# Altium footprint library QFP_QFN_DFN.PcbLib: 36 footprints (part 3 of 3)
Each footprint in its own frame and in the unit in brackets; x right, y up, seen from the top. Pads: shape width x height; smd on the part's side, far side on the other; paste and mask are expansions set on the pad; w line width, h text height; cw(c..) or ccw(c..) is an arc to the next point about the centre after c.
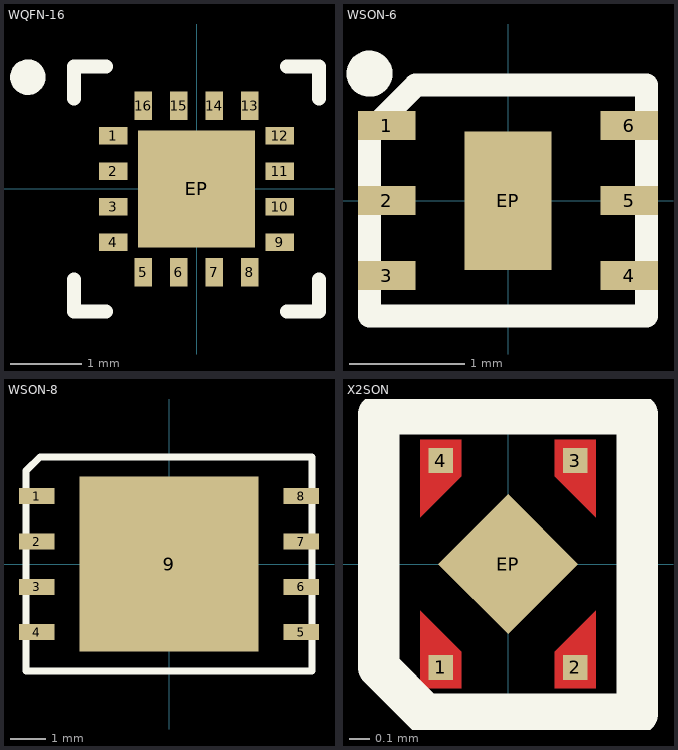
[diagram p2: the footprints below, top view; thin cyan lines are the x and y axes]

## WQFN-16 [mm]
height 0.8
pads (17):
  rect 0.4x0.25 smd: 1(-1.175,0.75) 2(-1.175,0.25) 3(-1.175,-0.25) 4(-1.175,-0.75) 9(1.175,-0.75) 10(1.175,-0.25) 11(1.175,0.25) 12(1.175,0.75)
  rect 0.25x0.4 smd: 5(-0.75,-1.175) 6(-0.25,-1.175) 7(0.25,-1.175) 8(0.75,-1.175) 13(0.75,1.175) 14(0.25,1.175) 15(-0.25,1.175) 16(-0.75,1.175)
  rect 1.65x1.65 smd: EP(0,0)
Top Overlay:
  circle w0.25: c-2.375,1.575 r0.125
  lines w0.2: -1.725,-1.275 -1.725,-1.725 -1.275,-1.725 ; -1.725,1.275 -1.725,1.725 -1.275,1.725 ; 1.275,-1.725 1.725,-1.725 1.725,-1.275 ; 1.275,1.725 1.725,1.725 1.725,1.275
3D body: height 0.8, standoff 0.08, extent -1.5,-1.5 1.5,1.5

## WSON-6 [mm]
pads (7):
  rect 0.5x0.25 smd: 1(-1.05,0.65) 2(-1.05,0) 3(-1.05,-0.65) 4(1.05,-0.65) 5(1.05,0) 6(1.05,0.65)
  rect 0.75x1.2 smd: EP(0,0)
Top Overlay:
  circle w0.2: c-1.2,1.1 r0.1
  lines w0.2: -1.2,-1 -1.2,0.6 -0.8,1 1.2,1 1.2,-1 -1.2,-1
3D body: height 0.8, standoff 0, extent -1.25,-1.1 1.25,1.1

## WSON-8 [mm] "WSON 8pin 8x6mm"
pads (9):
  rect 1x0.45 smd: 1(-3.7,1.9) 2(-3.7,0.63) 3(-3.7,-0.64) 4(-3.7,-1.91) 5(3.7,-1.91) 6(3.7,-0.64) 7(3.7,0.63) 8(3.7,1.9)
  rect 5x4.9 smd: 9(0,0)
Top Overlay:
  lines w0.2: -4,-3 3,-3 4,-3 4,3 -3.61,3 -4,2.61 -4,-3
3D body "User Library-WSON-8_6x8mm.STEP": height 0.81, standoff -0.07, extent -4,-3 4,3

## X2SON [mm]
pads (5):
  rect 0.12x0.12 smd: 1(-0.325,-0.5) 2(0.325,-0.5) 3(0.325,0.5) 4(-0.325,0.5)
  rect 0.48x0.48 smd rot 45 mask+0: EP(0,0)
Top Layer:
  region: -0.425,-0.225 -0.425,-0.6 -0.225,-0.6 -0.225,-0.425
  region: -0.425,0.225 -0.425,0.6 -0.225,0.6 -0.225,0.425
  region: 0.425,0.225 0.425,0.6 0.225,0.6 0.225,0.425
  region: 0.425,-0.225 0.425,-0.6 0.225,-0.6 0.225,-0.425
Top Overlay:
  lines w0.2: -0.625,-0.5 -0.4,-0.725 0.625,-0.725 0.625,0.725 -0.625,0.725 -0.625,-0.5
Top Solder:
  rectangle: -0.5,-0.5 0.5,0.5
3D body: height 0.38, standoff 0, extent -0.5,-0.5 0.5,0.5